# Altium footprint library Amirreza.PcbLib: 524 footprints (part 16 of 33)
Each footprint in its own frame and in the unit in brackets; x right, y up, seen from the top. Pads: shape width x height; smd on the part's side, far side on the other; paste and mask are expansions set on the pad; w line width, h text height; cw(c..) or ccw(c..) is an arc to the next point about the centre after c.
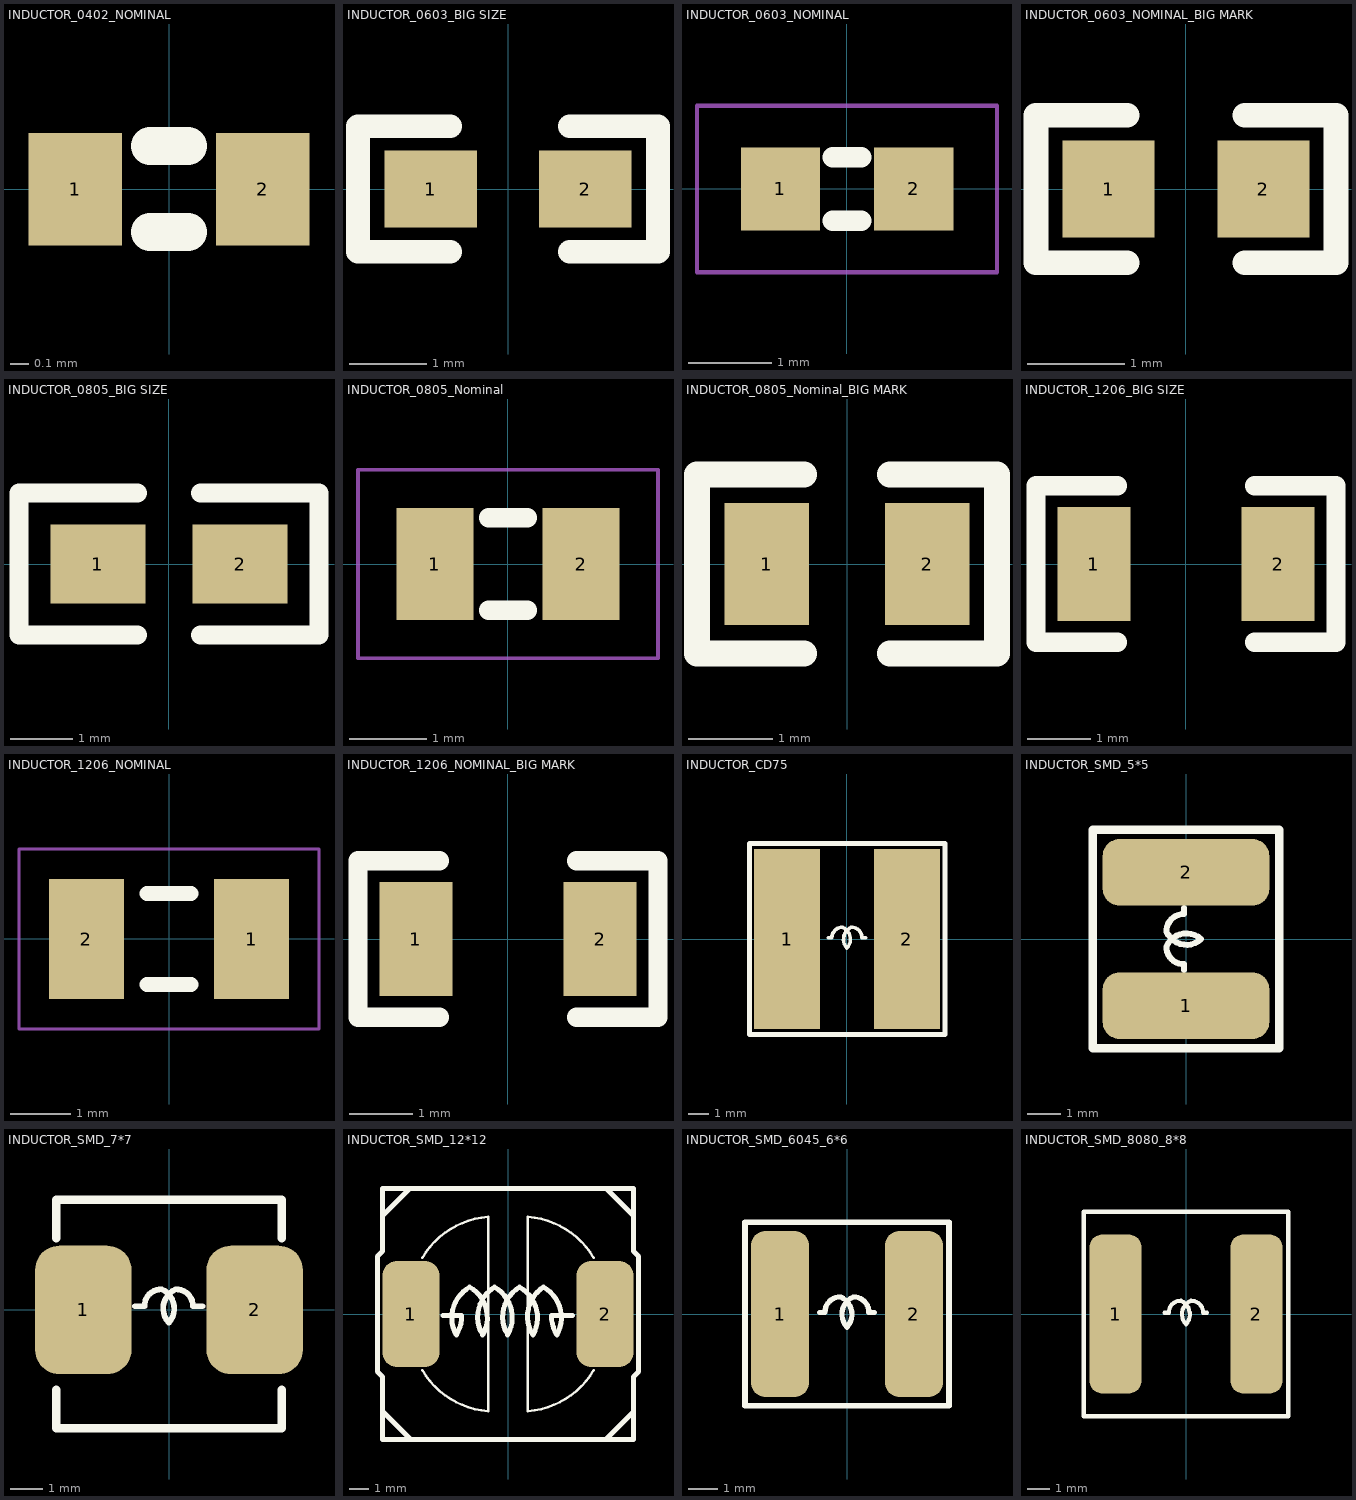
[diagram p15: the footprints below, top view; thin cyan lines are the x and y axes]

## INDUCTOR_0402_NOMINAL [mm] "CHIP Capacitor, 1.0X0.5mm, 0402"
height 0.4
pads (2):
  rect 0.5x0.6 smd: 1(-0.5,0) 2(0.5,0)
Top Overlay:
  lines w0.203: -0.102,-0.229 0.102,-0.229 ; -0.102,0.229 0.102,0.229
3D body "User Library-0402C.step": height 0.36, standoff 0, extent -0.5,-0.265 0.5,0.265

## INDUCTOR_0603_BIG SIZE [mm]
pads (2):
  rect 1.2x1 smd: 1(-1,0) 2(1,0)
Top Overlay:
  lines w0.305: -1.94,-0.813 -1.94,0.813 ; -1.889,-0.813 -0.746,-0.813 ; -1.889,0.813 -0.746,0.813 ; 0.797,-0.813 1.94,-0.813 1.94,0.813 0.797,0.813
3D body "44219.stp": height 0.8, standoff 0, extent -0.8,-0.4 0.8,0.4

## INDUCTOR_0603_NOMINAL [mm]
pads (2):
  rect 0.95x1 smd: 1(-0.8,0) 2(0.8,0)
Top Overlay:
  lines w0.25: -0.171,-0.381 0.171,-0.381 ; -0.171,0.381 0.171,0.381
Mechanical 13:
  lines w0.05: -1.8,-1 -1.8,1 1.8,1 1.8,-1 -1.8,-1
3D body "44219.stp": height 0.8, standoff 0, extent -0.8,-0.4 0.8,0.4

## INDUCTOR_0603_NOMINAL_BIG MARK [mm]
pads (2):
  rect 0.95x1 smd: 1(-0.8,0) 2(0.8,0)
Top Overlay:
  lines w0.254: -0.61,-0.762 -1.549,-0.762 -1.549,0.762 -0.61,0.762 ; 0.61,-0.762 1.549,-0.762 1.549,0.762 0.61,0.762
3D body "44219.stp": height 0.8, standoff 0, extent -0.8,-0.4 0.8,0.4

## INDUCTOR_0805_BIG SIZE [mil]
pads (2):
  rect 60x50 smd: 1(-45,0) 2(45,0)
Top Overlay:
  lines w12: -20,-45 -95,-45 -95,45 -20,45 ; 20,-45 95,-45 95,45 20,45
3D body "INDC2012X06L.step": height 21.65, standoff 0, extent -43.3,-28.54 43.31,28.54

## INDUCTOR_0805_Nominal [mm]
pads (2):
  rect 1x1.45 smd: 1(-0.95,0) 2(0.95,0)
Top Overlay:
  lines w0.25: -0.254,-0.6 0.254,-0.6 ; -0.254,0.6 0.254,0.6
Mechanical 13:
  lines w0.05: -1.95,-1.225 -1.95,1.225 1.95,1.225 1.95,-1.225 -1.95,-1.225
3D body "INDC2012X06L.step": height 0.55, standoff 0, extent -1.1,-0.725 1.1,0.725

## INDUCTOR_0805_Nominal_BIG MARK [mm]
pads (2):
  rect 1x1.45 smd: 1(-0.95,0) 2(0.95,0)
Top Overlay:
  lines w0.305: -0.507,-1.06 -1.778,-1.06 -1.778,1.06 -0.507,1.06 ; 0.507,-1.06 1.778,-1.06 1.778,1.06 0.507,1.06
3D body "INDC2012X06L.step": height 0.55, standoff 0, extent -1.1,-0.725 1.1,0.725

## INDUCTOR_1206_BIG SIZE [mm]
pads (2):
  rect 1.15x1.8 smd: 1(-1.45,0) 2(1.45,0)
Top Overlay:
  lines w0.305: -1.078,-1.23 -2.362,-1.23 -2.362,1.23 -1.078,1.23 ; 1.079,-1.23 2.362,-1.23 2.362,1.23 1.079,1.23
3D body "User Library-CR3216-1206.step": height 0.6, standoff 0, extent -1.6,-0.8 1.6,0.8

## INDUCTOR_1206_NOMINAL [mm]
pads (2):
  rect 1.25x2 smd: 1(1.375,0) 2(-1.375,0)
Top Overlay:
  lines w0.25: -0.369,-0.762 0.369,-0.762 ; -0.369,0.762 0.369,0.762
Mechanical 13:
  lines w0.05: -2.5,-1.5 2.5,-1.5 2.5,1.5 -2.5,1.5 -2.5,-1.5
3D body "User Library-CR3216-1206.step": height 0.6, standoff 0, extent -1.6,-0.8 1.6,0.8

## INDUCTOR_1206_NOMINAL_BIG MARK [mm]
pads (2):
  rect 1.15x1.8 smd: 1(-1.45,0) 2(1.45,0)
Top Overlay:
  lines w0.305: -1.078,-1.23 -2.362,-1.23 -2.362,1.23 -1.078,1.23 ; 1.079,-1.23 2.362,-1.23 2.362,1.23 1.079,1.23
3D body "User Library-CR3216-1206.step": height 0.6, standoff 0, extent -1.6,-0.8 1.6,0.8

## INDUCTOR_CD75 [mm]
pads (2):
  rect 3.3x9 smd: 1(-2.998,0) 2(2.999,0)
Top Overlay:
  lines w0.18: -0.937,0.055 -0.754,0.055 cw(c-0.241,0.07) -0.218,0.583 cw(c-0.481,-0.011) 0.004,-0.445 ; -0.003,-0.452 cw(c0.475,-0.011) 0.212,0.583 cw(c0.235,0.07) 0.749,0.055 0.932,0.055
  lines w0.254: -4.881,-4.775 -4.881,4.775 4.898,4.775 4.898,-4.775 -4.881,-4.775
3D body "User Library-DE0704.step": height 4.5, standoff 0, extent -3.65,-3.65 3.65,3.65

## INDUCTOR_SMD_5*5 [mm]
pads (2):
  rrect50% 5x2 smd: 1(0,-2) 2(0,2)
Top Overlay:
  lines w0.18: -0.055,-0.937 -0.055,-0.754 cw(c-0.07,-0.241) -0.583,-0.218 cw(c0.011,-0.481) 0.445,0.004 ; -0.055,0.932 -0.055,0.749 ccw(c-0.07,0.235) -0.583,0.212 ccw(c0.011,0.475) 0.452,-0.003
  lines w0.254: -2.794,-3.277 2.794,-3.277 2.794,3.277 -2.794,3.277 -2.794,-3.277
3D body "User Library-FERROCORE HPI0530-100.step": height 3.1, standoff 0, extent -2.485,-2.8 2.515,2.8

## INDUCTOR_SMD_7*7 [mm]
pads (2):
  rrect50% 3x4 smd: 1(-2.667,0) 2(2.667,0)
Top Overlay:
  lines w0.18: -1.061,0.112 -0.761,0.112 cw(c-0.247,0.127) -0.224,0.641 cw(c-0.487,0.046) -0.002,-0.388 ; -0.01,-0.395 cw(c0.469,0.046) 0.206,0.641 cw(c0.229,0.127) 0.743,0.112 1.043,0.112
  lines w0.254: -3.506,-2.483 -3.506,-3.683 3.506,-3.683 3.506,-2.483 ; -3.506,2.229 -3.506,3.429 3.506,3.429 3.506,2.229
3D body "User Library-DE0704.step": height 4.5, standoff 0, extent -3.65,-3.81 3.65,3.49

## INDUCTOR_SMD_12*12 [mm]
pads (2):
  rrect50% 2.9x5.4 smd: 1(-4.95,0) 2(4.95,0)
Top Overlay:
  lines w0.127: -4.369,-2.87 ccw(c-0.701,-0.706) -1.016,-4.953 -1.016,4.953 ccw(c-0.701,0.706) -4.369,2.87 ; 4.369,-2.87 cw(c0.701,-0.706) 1.016,-4.953 1.016,4.953 cw(c0.701,0.706) 4.369,2.87
  lines w0.254: -6.4,5.004 -5.004,6.4 ; -6.349,-5.004 -4.953,-6.4 ; -3.327,-0.076 -2.358,-0.076 cw(c-4.123,-0.089) -2.637,-1.041 ; -2.637,-1.067 cw(c-1.075,-0.191) -1.952,1.372 cw(c-2.841,-0.178) -1.291,-1.067 cw(c0.233,-0.152) -0.682,1.372 cw(c-1.571,-0.178) -0.021,-1.067 cw(c1.503,-0.152) 0.588,1.372 cw(c-0.288,-0.19) 1.274,-1.067 cw(c2.76,-0.114) 1.808,1.372 cw(c0.931,-0.19) 2.493,-1.067 ; 2.493,-1.041 cw(c3.979,-0.089) 2.214,-0.076 3.301,-0.076 ; 4.978,-6.4 6.375,-5.004 ; 5.004,6.4 6.4,5.004 ; -6.655,-2.945 -6.655,2.945 -6.4,3.2 -6.4,6.4 6.4,6.4 6.4,3.2 6.655,2.945 6.655,-2.945 6.4,-3.2 6.4,-6.4 -6.4,-6.4 -6.4,-3.2 -6.655,-2.945
3D body "User Library-A3D-010-00005.step": height 8.05, standoff 0.05, extent -6,-6 6,6

## INDUCTOR_SMD_6045_6*6 [mm]
pads (2):
  rrect50% 2x5.7 smd: 1(-2.3,0) 2(2.3,0)
Top Overlay:
  lines w0.18: -0.937,0.055 -0.754,0.055 cw(c-0.241,0.07) -0.218,0.583 cw(c-0.481,-0.011) 0.004,-0.445 ; -0.003,-0.452 cw(c0.475,-0.011) 0.212,0.583 cw(c0.235,0.07) 0.749,0.055 0.932,0.055
  lines w0.203: -3.5,-3.15 3.5,-3.15 3.5,3.15 -3.5,3.15 -3.5,-3.15
3D body "User Library-DJNR6028.STEP": height 2.59, standoff 0, extent -3,-3.073 3,3.073

## INDUCTOR_SMD_8080_8*8 [mm]
pads (2):
  rrect50% 2.3x7 smd: 1(-3.1,0) 2(3.1,0)
Top Overlay:
  lines w0.18: -0.937,0.055 -0.754,0.055 cw(c-0.241,0.07) -0.218,0.583 cw(c-0.481,-0.011) 0.004,-0.445 ; -0.003,-0.452 cw(c0.475,-0.011) 0.212,0.583 cw(c0.235,0.07) 0.749,0.055 0.932,0.055
  lines w0.203: -4.5,-4.5 4.5,-4.5 4.5,4.5 -4.5,4.5 -4.5,-4.5
3D body "User Library-LQH88P (3131 Size).step": height 3.83, standoff 0.03, extent -4,-4 4,4